# Altium footprint library 6-Connectors-4.PcbLib: 166 footprints (part 11 of 12)
Each footprint in its own frame and in the unit in brackets; x right, y up, seen from the top. Pads: shape width x height; smd on the part's side, far side on the other; paste and mask are expansions set on the pad; w line width, h text height; cw(c..) or ccw(c..) is an arc to the next point about the centre after c.
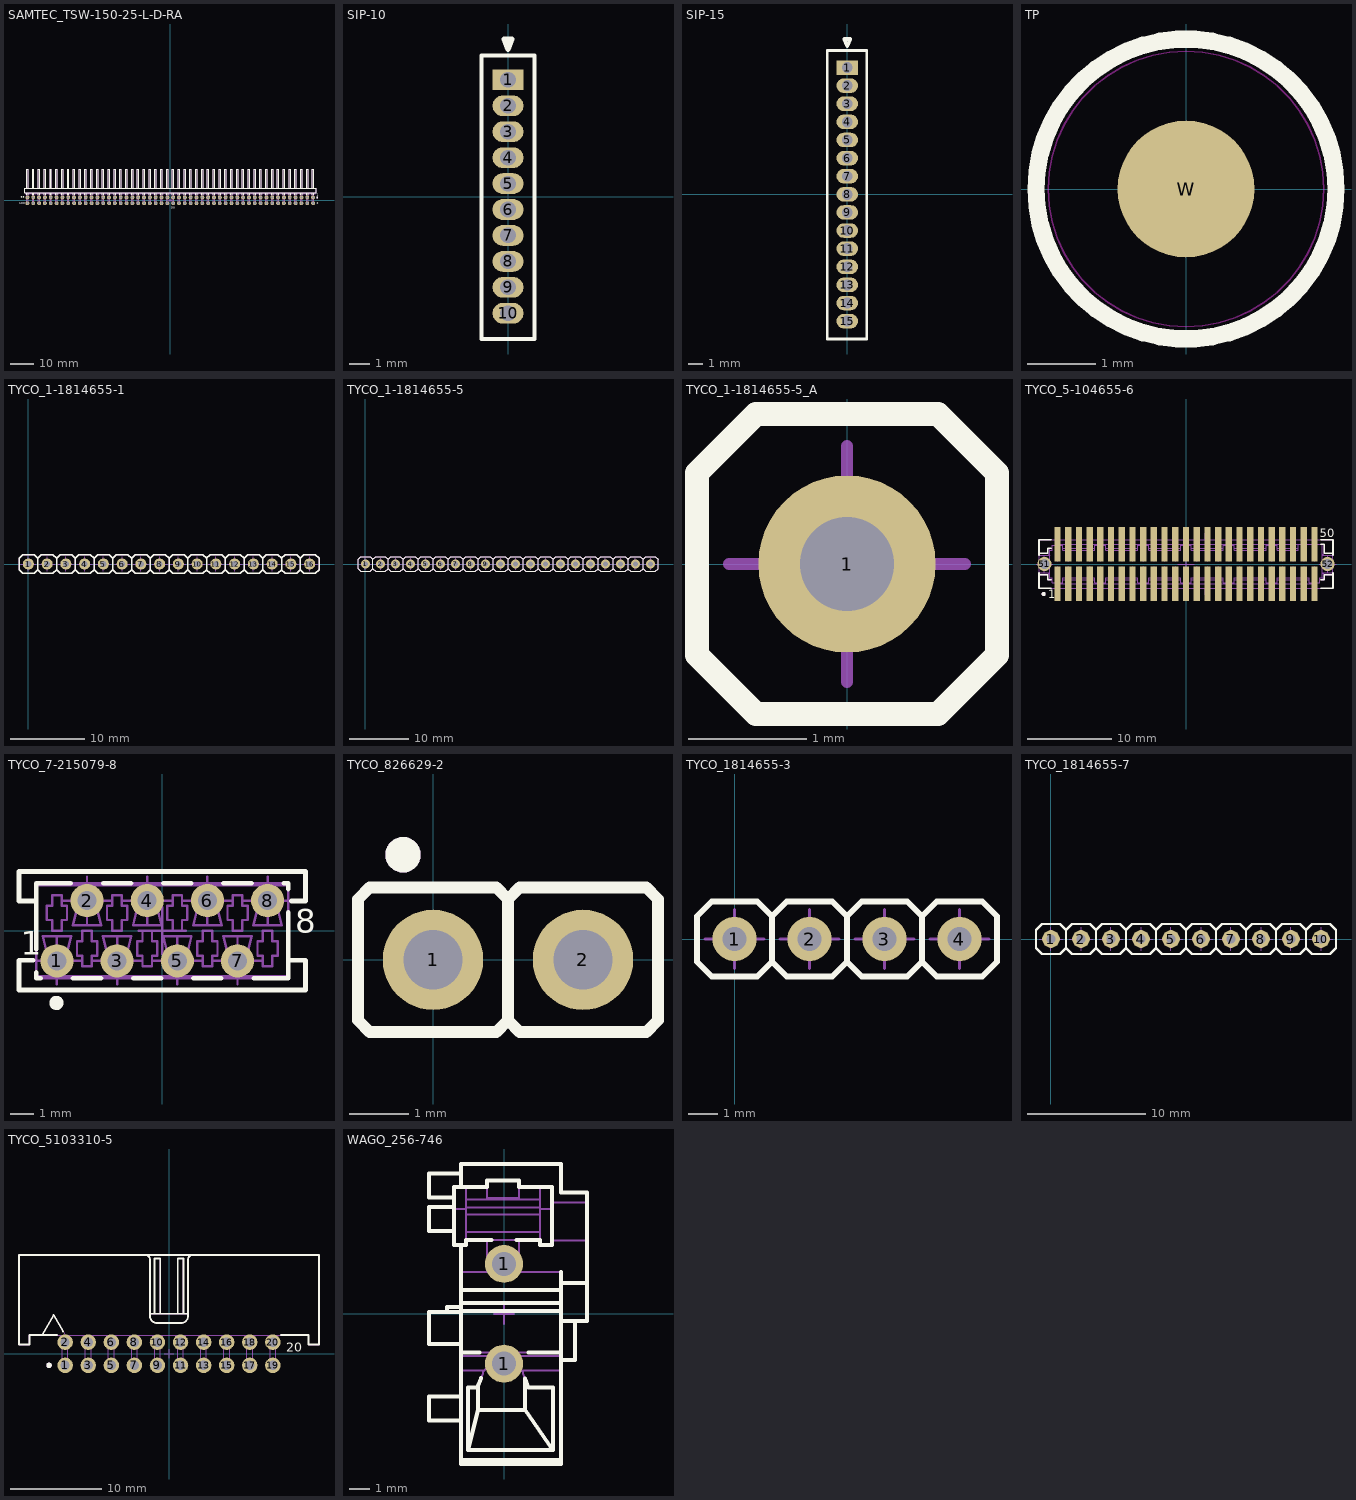
[diagram p10: the footprints below, top view; thin cyan lines are the x and y axes]

## SAMTEC_TSW-150-25-L-D-RA [mm] "100 Contacts - Pitch 2.54mm - Double Row Through Mount Right Angle Header"
height 5.56
pads (100):
  round 1.7 hole 1: 1(62.23,1.27) 2(62.23,-1.27) 3(59.69,1.27) 4(59.69,-1.27) 5(57.15,1.27) 6(57.15,-1.27) 7(54.61,1.27) 8(54.61,-1.27) 9(52.07,1.27) 10(52.07,-1.27) 11(49.53,1.27) 12(49.53,-1.27) 13(46.99,1.27) 14(46.99,-1.27) 15(44.45,1.27) 16(44.45,-1.27) 17(41.91,1.27) 18(41.91,-1.27) 19(39.37,1.27) 20(39.37,-1.27) 21(36.83,1.27) 22(36.83,-1.27) 23(34.29,1.27) 24(34.29,-1.27) 25(31.75,1.27) 26(31.75,-1.27) 27(29.21,1.27) 28(29.21,-1.27) 29(26.67,1.27) 30(26.67,-1.27) 31(24.13,1.27) 32(24.13,-1.27) 33(21.59,1.27) 34(21.59,-1.27) 35(19.05,1.27) 36(19.05,-1.27) 37(16.51,1.27) 38(16.51,-1.27) 39(13.97,1.27) 40(13.97,-1.27) 41(11.43,1.27) 42(11.43,-1.27) 43(8.89,1.27) 44(8.89,-1.27) 45(6.35,1.27) 46(6.35,-1.27) 47(3.81,1.27) 48(3.81,-1.27) 49(1.27,1.27) 50(1.27,-1.27) 51(-1.27,1.27) 52(-1.27,-1.27) 53(-3.81,1.27) 54(-3.81,-1.27) 55(-6.35,1.27) 56(-6.35,-1.27) 57(-8.89,1.27) 58(-8.89,-1.27) 59(-11.43,1.27) 60(-11.43,-1.27) 61(-13.97,1.27) 62(-13.97,-1.27) 63(-16.51,1.27) 64(-16.51,-1.27) 65(-19.05,1.27) 66(-19.05,-1.27) 67(-21.59,1.27) 68(-21.59,-1.27) 69(-24.13,1.27) 70(-24.13,-1.27) 71(-26.67,1.27) 72(-26.67,-1.27) 73(-29.21,1.27) 74(-29.21,-1.27) 75(-31.75,1.27) 76(-31.75,-1.27) 77(-34.29,1.27) 78(-34.29,-1.27) 79(-36.83,1.27) 80(-36.83,-1.27) 81(-39.37,1.27) 82(-39.37,-1.27) 83(-41.91,1.27) 84(-41.91,-1.27) 85(-44.45,1.27) 86(-44.45,-1.27) 87(-46.99,1.27) 88(-46.99,-1.27) 89(-49.53,1.27) 90(-49.53,-1.27) 91(-52.07,1.27) 92(-52.07,-1.27) 93(-54.61,1.27) 94(-54.61,-1.27) 95(-57.15,1.27) 96(-57.15,-1.27) 97(-59.69,1.27) 98(-59.69,-1.27) 99(-62.23,1.27) 100(-62.23,-1.27)
Top Overlay:
  drawing of 255 lines, arcs and shapes, not listed
  text "99" at -65.125,0.89 h1
  text "100" at -65.9,-1.735 h1
  text "50" at 0.5,-3.59 h1
  text "1" at 63.78,1.89 h1.02
  text "2" at 63.748,-1.668 h1
Mechanical 8:
  drawing of 404 lines, arcs and shapes, not listed
Mechanical 14:
  drawing of 605 lines, arcs and shapes, not listed
  text "99" at -65.125,0.89 h1
  text "100" at -65.9,-1.735 h1
  text "50" at 0.5,-3.59 h1
  text "1" at 63.78,1.89 h1.02
  text "2" at 63.748,-1.668 h1
3D body "SAMTEC_TSW-150-25-L-D-RA.stp": height 5.56, standoff -2.54, extent -63.5,-1.587 63.5,13.462
3D body "v160-080.stp": height 0.02, standoff -1.65, extent -52.87,0.47 -51.27,2.07
3D body "v160-080.stp": height 0.02, standoff -1.65, extent -55.41,0.47 -53.81,2.07
3D body "v160-080.stp": height 0.02, standoff -1.65, extent -57.95,0.47 -56.35,2.07
3D body "v160-080.stp": height 0.02, standoff -1.65, extent -60.49,0.47 -58.89,2.07
3D body "v160-080.stp": height 0.02, standoff -1.65, extent -63.03,0.47 -61.43,2.07
3D body "v160-080.stp": height 0.02, standoff -1.65, extent -52.87,-2.07 -51.27,-0.47
3D body "v160-080.stp": height 0.02, standoff -1.65, extent -55.41,-2.07 -53.81,-0.47
3D body "v160-080.stp": height 0.02, standoff -1.65, extent -57.95,-2.07 -56.35,-0.47
3D body "v160-080.stp": height 0.02, standoff -1.65, extent -60.49,-2.07 -58.89,-0.47
3D body "v160-080.stp": height 0.02, standoff -1.65, extent -63.03,-2.07 -61.43,-0.47
3D body "v160-080.stp": height 0.02, standoff -1.65, extent -40.17,0.47 -38.57,2.07
3D body "v160-080.stp": height 0.02, standoff -1.65, extent -42.71,0.47 -41.11,2.07
3D body "v160-080.stp": height 0.02, standoff -1.65, extent -45.25,0.47 -43.65,2.07
3D body "v160-080.stp": height 0.02, standoff -1.65, extent -47.79,0.47 -46.19,2.07
3D body "v160-080.stp": height 0.02, standoff -1.65, extent -50.33,0.47 -48.73,2.07
3D body "v160-080.stp": height 0.02, standoff -1.65, extent -40.17,-2.07 -38.57,-0.47
3D body "v160-080.stp": height 0.02, standoff -1.65, extent -42.71,-2.07 -41.11,-0.47
3D body "v160-080.stp": height 0.02, standoff -1.65, extent -45.25,-2.07 -43.65,-0.47
3D body "v160-080.stp": height 0.02, standoff -1.65, extent -47.79,-2.07 -46.19,-0.47
3D body "v160-080.stp": height 0.02, standoff -1.65, extent -50.33,-2.07 -48.73,-0.47
3D body "v160-080.stp": height 0.02, standoff -1.65, extent -27.47,0.47 -25.87,2.07
3D body "v160-080.stp": height 0.02, standoff -1.65, extent -30.01,0.47 -28.41,2.07
3D body "v160-080.stp": height 0.02, standoff -1.65, extent -32.55,0.47 -30.95,2.07
3D body "v160-080.stp": height 0.02, standoff -1.65, extent -35.09,0.47 -33.49,2.07
3D body "v160-080.stp": height 0.02, standoff -1.65, extent -37.63,0.47 -36.03,2.07
3D body "v160-080.stp": height 0.02, standoff -1.65, extent -27.47,-2.07 -25.87,-0.47
3D body "v160-080.stp": height 0.02, standoff -1.65, extent -30.01,-2.07 -28.41,-0.47
3D body "v160-080.stp": height 0.02, standoff -1.65, extent -32.55,-2.07 -30.95,-0.47
3D body "v160-080.stp": height 0.02, standoff -1.65, extent -35.09,-2.07 -33.49,-0.47
3D body "v160-080.stp": height 0.02, standoff -1.65, extent -37.63,-2.07 -36.03,-0.47
3D body "v160-080.stp": height 0.02, standoff -1.65, extent -14.77,0.47 -13.17,2.07
3D body "v160-080.stp": height 0.02, standoff -1.65, extent -17.31,0.47 -15.71,2.07
3D body "v160-080.stp": height 0.02, standoff -1.65, extent -19.85,0.47 -18.25,2.07
3D body "v160-080.stp": height 0.02, standoff -1.65, extent -22.39,0.47 -20.79,2.07
3D body "v160-080.stp": height 0.02, standoff -1.65, extent -24.93,0.47 -23.33,2.07
3D body "v160-080.stp": height 0.02, standoff -1.65, extent -14.77,-2.07 -13.17,-0.47
3D body "v160-080.stp": height 0.02, standoff -1.65, extent -17.31,-2.07 -15.71,-0.47
3D body "v160-080.stp": height 0.02, standoff -1.65, extent -19.85,-2.07 -18.25,-0.47
3D body "v160-080.stp": height 0.02, standoff -1.65, extent -22.39,-2.07 -20.79,-0.47
3D body "v160-080.stp": height 0.02, standoff -1.65, extent -24.93,-2.07 -23.33,-0.47
3D body "v160-080.stp": height 0.02, standoff -1.65, extent -2.07,0.47 -0.47,2.07
3D body "v160-080.stp": height 0.02, standoff -1.65, extent -4.61,0.47 -3.01,2.07
3D body "v160-080.stp": height 0.02, standoff -1.65, extent -7.15,0.47 -5.55,2.07
3D body "v160-080.stp": height 0.02, standoff -1.65, extent -9.69,0.47 -8.09,2.07
3D body "v160-080.stp": height 0.02, standoff -1.65, extent -12.23,0.47 -10.63,2.07
3D body "v160-080.stp": height 0.02, standoff -1.65, extent -2.07,-2.07 -0.47,-0.47
3D body "v160-080.stp": height 0.02, standoff -1.65, extent -4.61,-2.07 -3.01,-0.47
3D body "v160-080.stp": height 0.02, standoff -1.65, extent -7.15,-2.07 -5.55,-0.47
3D body "v160-080.stp": height 0.02, standoff -1.65, extent -9.69,-2.07 -8.09,-0.47
3D body "v160-080.stp": height 0.02, standoff -1.65, extent -12.23,-2.07 -10.63,-0.47
3D body "v160-080.stp": height 0.02, standoff -1.65, extent 10.63,0.47 12.23,2.07
3D body "v160-080.stp": height 0.02, standoff -1.65, extent 8.09,0.47 9.69,2.07
3D body "v160-080.stp": height 0.02, standoff -1.65, extent 5.55,0.47 7.15,2.07
3D body "v160-080.stp": height 0.02, standoff -1.65, extent 3.01,0.47 4.61,2.07
3D body "v160-080.stp": height 0.02, standoff -1.65, extent 0.47,0.47 2.07,2.07
3D body "v160-080.stp": height 0.02, standoff -1.65, extent 10.63,-2.07 12.23,-0.47
3D body "v160-080.stp": height 0.02, standoff -1.65, extent 8.09,-2.07 9.69,-0.47
3D body "v160-080.stp": height 0.02, standoff -1.65, extent 5.55,-2.07 7.15,-0.47
3D body "v160-080.stp": height 0.02, standoff -1.65, extent 3.01,-2.07 4.61,-0.47
3D body "v160-080.stp": height 0.02, standoff -1.65, extent 0.47,-2.07 2.07,-0.47
3D body "v160-080.stp": height 0.02, standoff -1.65, extent 23.33,0.47 24.93,2.07
3D body "v160-080.stp": height 0.02, standoff -1.65, extent 20.79,0.47 22.39,2.07
3D body "v160-080.stp": height 0.02, standoff -1.65, extent 18.25,0.47 19.85,2.07
3D body "v160-080.stp": height 0.02, standoff -1.65, extent 15.71,0.47 17.31,2.07
3D body "v160-080.stp": height 0.02, standoff -1.65, extent 13.17,0.47 14.77,2.07
3D body "v160-080.stp": height 0.02, standoff -1.65, extent 23.33,-2.07 24.93,-0.47
3D body "v160-080.stp": height 0.02, standoff -1.65, extent 20.79,-2.07 22.39,-0.47
3D body "v160-080.stp": height 0.02, standoff -1.65, extent 18.25,-2.07 19.85,-0.47
3D body "v160-080.stp": height 0.02, standoff -1.65, extent 15.71,-2.07 17.31,-0.47
3D body "v160-080.stp": height 0.02, standoff -1.65, extent 13.17,-2.07 14.77,-0.47
3D body "v160-080.stp": height 0.02, standoff -1.65, extent 36.03,0.47 37.63,2.07
3D body "v160-080.stp": height 0.02, standoff -1.65, extent 33.49,0.47 35.09,2.07
3D body "v160-080.stp": height 0.02, standoff -1.65, extent 30.95,0.47 32.55,2.07
3D body "v160-080.stp": height 0.02, standoff -1.65, extent 28.41,0.47 30.01,2.07
3D body "v160-080.stp": height 0.02, standoff -1.65, extent 25.87,0.47 27.47,2.07
3D body "v160-080.stp": height 0.02, standoff -1.65, extent 36.03,-2.07 37.63,-0.47
3D body "v160-080.stp": height 0.02, standoff -1.65, extent 33.49,-2.07 35.09,-0.47
3D body "v160-080.stp": height 0.02, standoff -1.65, extent 30.95,-2.07 32.55,-0.47
3D body "v160-080.stp": height 0.02, standoff -1.65, extent 28.41,-2.07 30.01,-0.47
3D body "v160-080.stp": height 0.02, standoff -1.65, extent 25.87,-2.07 27.47,-0.47
3D body "v160-080.stp": height 0.02, standoff -1.65, extent 48.73,0.47 50.33,2.07
3D body "v160-080.stp": height 0.02, standoff -1.65, extent 46.19,0.47 47.79,2.07
3D body "v160-080.stp": height 0.02, standoff -1.65, extent 43.65,0.47 45.25,2.07
3D body "v160-080.stp": height 0.02, standoff -1.65, extent 41.11,0.47 42.71,2.07
3D body "v160-080.stp": height 0.02, standoff -1.65, extent 38.57,0.47 40.17,2.07
3D body "v160-080.stp": height 0.02, standoff -1.65, extent 48.73,-2.07 50.33,-0.47
3D body "v160-080.stp": height 0.02, standoff -1.65, extent 46.19,-2.07 47.79,-0.47
3D body "v160-080.stp": height 0.02, standoff -1.65, extent 43.65,-2.07 45.25,-0.47
3D body "v160-080.stp": height 0.02, standoff -1.65, extent 41.11,-2.07 42.71,-0.47
3D body "v160-080.stp": height 0.02, standoff -1.65, extent 38.57,-2.07 40.17,-0.47
3D body "v160-080.stp": height 0.02, standoff -1.65, extent 61.43,0.47 63.03,2.07
3D body "v160-080.stp": height 0.02, standoff -1.65, extent 58.89,0.47 60.49,2.07
3D body "v160-080.stp": height 0.02, standoff -1.65, extent 56.35,0.47 57.95,2.07
3D body "v160-080.stp": height 0.02, standoff -1.65, extent 53.81,0.47 55.41,2.07
3D body "v160-080.stp": height 0.02, standoff -1.65, extent 51.27,0.47 52.87,2.07
3D body "v160-080.stp": height 0.02, standoff -1.65, extent 61.43,-2.07 63.03,-0.47
3D body "v160-080.stp": height 0.02, standoff -1.65, extent 58.89,-2.07 60.49,-0.47
3D body "v160-080.stp": height 0.02, standoff -1.65, extent 56.35,-2.07 57.95,-0.47
3D body "v160-080.stp": height 0.02, standoff -1.65, extent 53.81,-2.07 55.41,-0.47
3D body "v160-080.stp": height 0.02, standoff -1.65, extent 51.27,-2.07 52.87,-0.47

## SIP-10 [mil]
height 962.6
pads (10):
  rect 60x40 / inner round 40 / far side rect 60x40 hole 30: 1(0,225)
  oval 60x40 / inner round 40 / far side oval 60x40 hole 30: 2(0,175) 3(0,125) 4(0,75) 5(0,25) 6(0,-25) 7(0,-75) 8(0,-125) 9(0,-175) 10(0,-225)
Top Overlay:
  lines w8: -51.18,-274.61 51.18,-274.61 51.18,272.24 -51.18,272.24 -51.18,-274.61
  lines w10: -7.87,303.74 7.87,303.74 0,284.06 -7.87,303.74
3D body "sip-10.stp": height 165.35, standoff -98.43, extent -43.31,-265.74 43.3,265.75

## SIP-15 [mil]
height 962.6
pads (15):
  rect 60x40 / inner round 40 / far side rect 60x40 hole 30: 1(0,350)
  oval 60x40 / inner round 40 / far side oval 60x40 hole 30: 2(0,300) 3(0,250) 4(0,200) 5(0,150) 6(0,100) 7(0,50) 8(0,0) 9(0,-50) 10(0,-100) 11(0,-150) 12(0,-200) 13(0,-250) 14(0,-300) 15(0,-350)
Top Overlay:
  lines w8: -55.12,-399.35 -21.46,-399.35 53.64,-399.35 53.64,397.24 -55.12,397.24 -55.12,-399.35
  lines w10: -7.87,428.74 0,409.06 7.87,428.74 -7.87,428.74
3D body "sip-15.stp": height 161.42, standoff -118.11, extent -47.24,-389.76 47.25,389.76

## TP [mm]
height 11.7
pads (1):
  round 2 smd mask+1: W(0,0)
Top Overlay:
  circle w0.254: c0,0 r2.195
Keep-Out Layer:
  circle w0.025: c0,0 r2.017
3D body "1_016-1_016-3_tp.stp": height 0.02, standoff 0, extent -1.5,-1.5 1.5,1.5

## TYCO_1-1814655-1 [mm] "16 Positions, Pitch 2.54mm, Width 2.54mm, Heigh 4.4mm, SIP Straight Socket"
height 4.4
pads (16):
  round 1.5 hole 0.8: 1(0,0) 2(2.54,0) 3(5.08,0) 4(7.62,0) 5(10.16,0) 6(12.7,0) 7(15.24,0) 8(17.78,0) 9(20.32,0) 10(22.86,0) 11(25.4,0) 12(27.94,0) 13(30.48,0) 14(33.02,0) 15(35.56,0) 16(38.1,0)
Top Overlay:
  lines w0.2: 1.27,-0.77 1.27,0.77 ; 1.27,-0.77 1.77,-1.27 3.31,-1.27 3.81,-0.77 ; 1.27,-0.77 0.77,-1.27 -0.77,-1.27 -1.27,-0.77 -1.27,0.77 -0.77,1.27 0.77,1.27 1.27,0.77 ; 1.27,0.77 1.77,1.27 3.31,1.27 3.81,0.77 ; 3.81,-0.77 3.81,0.77 ; 3.81,-0.77 4.31,-1.27 5.85,-1.27 6.35,-0.77 ; 3.81,0.77 4.31,1.27 5.85,1.27 6.35,0.77 ; 6.35,-0.77 6.35,0.77 ; 6.35,-0.77 6.85,-1.27 8.39,-1.27 8.89,-0.77 ; 6.35,0.77 6.85,1.27 8.39,1.27 8.89,0.77 ; 8.89,-0.77 8.89,0.77 ; 8.89,-0.77 9.39,-1.27 10.93,-1.27 11.43,-0.77 ; 8.89,0.77 9.39,1.27 10.93,1.27 11.43,0.77 ; 11.43,-0.77 11.43,0.77 ; 11.43,-0.77 11.93,-1.27 13.47,-1.27 13.97,-0.77 ; 11.43,0.77 11.93,1.27 13.47,1.27 13.97,0.77 ; 13.97,-0.77 13.97,0.77 ; 13.97,-0.77 14.47,-1.27 16.01,-1.27 16.51,-0.77 ; 13.97,0.77 14.47,1.27 16.01,1.27 16.51,0.77 ; 16.51,-0.77 16.51,0.77 ; 16.51,-0.77 17.01,-1.27 18.55,-1.27 19.05,-0.77 ; 16.51,0.77 17.01,1.27 18.55,1.27 19.05,0.77 ; 19.05,-0.77 19.05,0.77 ; 19.05,-0.77 19.55,-1.27 21.09,-1.27 21.59,-0.77 ; 19.05,0.77 19.55,1.27 21.09,1.27 21.59,0.77 ; 21.59,-0.77 21.59,0.77 ; 21.59,-0.77 22.09,-1.27 23.63,-1.27 24.13,-0.77 ; 21.59,0.77 22.09,1.27 23.63,1.27 24.13,0.77 ; 24.13,-0.77 24.13,0.77 ; 24.13,-0.77 24.63,-1.27 26.17,-1.27 26.67,-0.77 ; 24.13,0.77 24.63,1.27 26.17,1.27 26.67,0.77 ; 26.67,-0.77 27.17,-1.27 28.71,-1.27 29.21,-0.77 ; 26.67,-0.77 26.67,0.77 ; 26.67,0.77 27.17,1.27 28.71,1.27 29.21,0.77 ; 29.21,-0.77 29.71,-1.27 31.25,-1.27 31.75,-0.77 ; 29.21,-0.77 29.21,0.77 ; 29.21,0.77 29.71,1.27 31.25,1.27 31.75,0.77 ; 31.75,-0.77 32.25,-1.27 33.79,-1.27 34.29,-0.77 ; 31.75,-0.77 31.75,0.77 ; 31.75,0.77 32.25,1.27 33.79,1.27 34.29,0.77 ; 34.29,-0.77 34.29,0.77 ; 34.29,-0.77 34.79,-1.27 36.33,-1.27 36.83,-0.77 ; 34.29,0.77 34.79,1.27 36.33,1.27 36.83,0.77 ; 36.83,-0.77 36.83,0.77 ; 36.83,-0.77 37.33,-1.27 38.87,-1.27 39.37,-0.77 39.37,0.77 38.87,1.27 37.33,1.27 36.83,0.77
Mechanical 8:
  lines w0.1: -1,0 0,0 ; 0,-1 0,0 ; 0,1 0,0 ; 1,0 0,0 ; 1.54,0 2.54,0 ; 2.54,-1 2.54,0 ; 2.54,1 2.54,0 ; 3.54,0 2.54,0 ; 4.08,0 5.08,0 ; 5.08,-1 5.08,0 ; 5.08,1 5.08,0 ; 6.08,0 5.08,0 ; 6.62,0 7.62,0 ; 7.62,-1 7.62,0 ; 7.62,1 7.62,0 ; 8.62,0 7.62,0 ; 9.16,0 10.16,0 ; 10.16,-1 10.16,0 ; 10.16,1 10.16,0 ; 11.16,0 10.16,0 ; 11.7,0 12.7,0 ; 12.7,-1 12.7,0 ; 12.7,1 12.7,0 ; 13.7,0 12.7,0 ; 14.24,0 15.24,0 ; 15.24,-1 15.24,0 ; 15.24,1 15.24,0 ; 16.24,0 15.24,0 ; 16.78,0 17.78,0 ; 17.78,-1 17.78,0 ; 17.78,1 17.78,0 ; 18.78,0 17.78,0 ; 19.32,0 20.32,0 ; 20.32,-1 20.32,0 ; 20.32,1 20.32,0 ; 21.32,0 20.32,0 ; 21.86,0 22.86,0 ; 22.86,-1 22.86,0 ; 22.86,1 22.86,0 ; 23.86,0 22.86,0 ; 24.4,0 25.4,0 ; 25.4,-1 25.4,0 ; 25.4,1 25.4,0 ; 26.4,0 25.4,0 ; 26.94,0 27.94,0 ; 27.94,-1 27.94,0 ; 27.94,1 27.94,0 ; 28.94,0 27.94,0 ; 29.48,0 30.48,0 ; 30.48,-1 30.48,0 ; 30.48,1 30.48,0 ; 31.48,0 30.48,0 ; 32.02,0 33.02,0 ; 33.02,-1 33.02,0 ; 33.02,1 33.02,0 ; 34.02,0 33.02,0 ; 34.56,0 35.56,0 ; 35.56,-1 35.56,0 ; 35.56,1 35.56,0 ; 36.56,0 35.56,0 ; 37.1,0 38.1,0 ; 38.1,-1 38.1,0 ; 38.1,1 38.1,0 ; 39.1,0 38.1,0
Mechanical 14:
  lines w0.1: 1.27,-0.77 1.27,0.77 ; 1.27,-0.77 1.77,-1.27 3.31,-1.27 3.81,-0.77 ; 1.27,-0.77 0.77,-1.27 -0.77,-1.27 -1.27,-0.77 -1.27,0.77 -0.77,1.27 0.77,1.27 1.27,0.77 ; 1.27,0.77 1.77,1.27 3.31,1.27 3.81,0.77 ; 3.81,-0.77 3.81,0.77 ; 3.81,-0.77 4.31,-1.27 5.85,-1.27 6.35,-0.77 ; 3.81,0.77 4.31,1.27 5.85,1.27 6.35,0.77 ; 6.35,-0.77 6.35,0.77 ; 6.35,-0.77 6.85,-1.27 8.39,-1.27 8.89,-0.77 ; 6.35,0.77 6.85,1.27 8.39,1.27 8.89,0.77 ; 8.89,-0.77 8.89,0.77 ; 8.89,-0.77 9.39,-1.27 10.93,-1.27 11.43,-0.77 ; 8.89,0.77 9.39,1.27 10.93,1.27 11.43,0.77 ; 11.43,-0.77 11.43,0.77 ; 11.43,-0.77 11.93,-1.27 13.47,-1.27 13.97,-0.77 ; 11.43,0.77 11.93,1.27 13.47,1.27 13.97,0.77 ; 13.97,-0.77 13.97,0.77 ; 13.97,-0.77 14.47,-1.27 16.01,-1.27 16.51,-0.77 ; 13.97,0.77 14.47,1.27 16.01,1.27 16.51,0.77 ; 16.51,-0.77 16.51,0.77 ; 16.51,-0.77 17.01,-1.27 18.55,-1.27 19.05,-0.77 ; 16.51,0.77 17.01,1.27 18.55,1.27 19.05,0.77 ; 19.05,-0.77 19.05,0.77 ; 19.05,-0.77 19.55,-1.27 21.09,-1.27 21.59,-0.77 ; 19.05,0.77 19.55,1.27 21.09,1.27 21.59,0.77 ; 21.59,-0.77 21.59,0.77 ; 21.59,-0.77 22.09,-1.27 23.63,-1.27 24.13,-0.77 ; 21.59,0.77 22.09,1.27 23.63,1.27 24.13,0.77 ; 24.13,-0.77 24.13,0.77 ; 24.13,-0.77 24.63,-1.27 26.17,-1.27 26.67,-0.77 ; 24.13,0.77 24.63,1.27 26.17,1.27 26.67,0.77 ; 26.67,-0.77 27.17,-1.27 28.71,-1.27 29.21,-0.77 ; 26.67,-0.77 26.67,0.77 ; 26.67,0.77 27.17,1.27 28.71,1.27 29.21,0.77 ; 29.21,-0.77 29.71,-1.27 31.25,-1.27 31.75,-0.77 ; 29.21,-0.77 29.21,0.77 ; 29.21,0.77 29.71,1.27 31.25,1.27 31.75,0.77 ; 31.75,-0.77 32.25,-1.27 33.79,-1.27 34.29,-0.77 ; 31.75,-0.77 31.75,0.77 ; 31.75,0.77 32.25,1.27 33.79,1.27 34.29,0.77 ; 34.29,-0.77 34.29,0.77 ; 34.29,-0.77 34.79,-1.27 36.33,-1.27 36.83,-0.77 ; 34.29,0.77 34.79,1.27 36.33,1.27 36.83,0.77 ; 36.83,-0.77 36.83,0.77 ; 36.83,-0.77 37.33,-1.27 38.87,-1.27 39.37,-0.77 39.37,0.77 38.87,1.27 37.33,1.27 36.83,0.77
3D body "TYCO_1-1814655-1.stp": height 4.4, standoff -2.9, extent -1.27,-1.27 39.37,1.27

## TYCO_1-1814655-5 [mm] "20 Positions, Pitch 2.54mm, Width 2.54mm, Heigh 4.4mm, SIP Straight Socket"
height 4.4
pads (20):
  round 1.5 hole 0.8: 1(0,0) 2(2.54,0) 3(5.08,0) 4(7.62,0) 5(10.16,0) 6(12.7,0) 7(15.24,0) 8(17.78,0) 9(20.32,0) 10(22.86,0) 11(25.4,0) 12(27.94,0) 13(30.48,0) 14(33.02,0) 15(35.56,0) 16(38.1,0) 17(40.64,0) 18(43.18,0) 19(45.72,0) 20(48.26,0)
Top Overlay:
  lines w0.2: 1.27,-0.77 0.77,-1.27 -0.77,-1.27 -1.27,-0.77 -1.27,0.77 -0.77,1.27 0.77,1.27 1.27,0.77 ; 1.27,-0.77 1.77,-1.27 3.31,-1.27 3.81,-0.77 ; 1.27,-0.77 1.27,0.77 ; 1.27,0.77 1.77,1.27 3.31,1.27 3.81,0.77 ; 3.81,-0.77 4.31,-1.27 5.85,-1.27 6.35,-0.77 ; 3.81,-0.77 3.81,0.77 ; 3.81,0.77 4.31,1.27 5.85,1.27 6.35,0.77 ; 6.35,-0.77 6.85,-1.27 8.39,-1.27 8.89,-0.77 ; 6.35,-0.77 6.35,0.77 ; 6.35,0.77 6.85,1.27 8.39,1.27 8.89,0.77 ; 8.89,-0.77 9.39,-1.27 10.93,-1.27 11.43,-0.77 ; 8.89,-0.77 8.89,0.77 ; 8.89,0.77 9.39,1.27 10.93,1.27 11.43,0.77 ; 11.43,-0.77 11.93,-1.27 13.47,-1.27 13.97,-0.77 ; 11.43,-0.77 11.43,0.77 ; 11.43,0.77 11.93,1.27 13.47,1.27 13.97,0.77 ; 13.97,-0.77 14.47,-1.27 16.01,-1.27 16.51,-0.77 ; 13.97,-0.77 13.97,0.77 ; 13.97,0.77 14.47,1.27 16.01,1.27 16.51,0.77 ; 16.51,-0.77 17.01,-1.27 18.55,-1.27 19.05,-0.77 ; 16.51,-0.77 16.51,0.77 ; 16.51,0.77 17.01,1.27 18.55,1.27 19.05,0.77 ; 19.05,-0.77 19.55,-1.27 21.09,-1.27 21.59,-0.77 ; 19.05,-0.77 19.05,0.77 ; 19.05,0.77 19.55,1.27 21.09,1.27 21.59,0.77 ; 21.59,-0.77 22.09,-1.27 23.63,-1.27 24.13,-0.77 ; 21.59,-0.77 21.59,0.77 ; 21.59,0.77 22.09,1.27 23.63,1.27 24.13,0.77 ; 24.13,-0.77 24.63,-1.27 26.17,-1.27 26.67,-0.77 ; 24.13,-0.77 24.13,0.77 ; 24.13,0.77 24.63,1.27 26.17,1.27 26.67,0.77 ; 26.67,-0.77 26.67,0.77 ; 26.67,-0.77 27.17,-1.27 28.71,-1.27 29.21,-0.77 ; 26.67,0.77 27.17,1.27 28.71,1.27 29.21,0.77 ; 29.21,-0.77 29.21,0.77 ; 29.21,-0.77 29.71,-1.27 31.25,-1.27 31.75,-0.77 ; 29.21,0.77 29.71,1.27 31.25,1.27 31.75,0.77 ; 31.75,-0.77 31.75,0.77 ; 31.75,-0.77 32.25,-1.27 33.79,-1.27 34.29,-0.77 ; 31.75,0.77 32.25,1.27 33.79,1.27 34.29,0.77 ; 34.29,-0.77 34.79,-1.27 36.33,-1.27 36.83,-0.77 ; 34.29,-0.77 34.29,0.77 ; 34.29,0.77 34.79,1.27 36.33,1.27 36.83,0.77 ; 36.83,-0.77 37.33,-1.27 38.87,-1.27 39.37,-0.77 ; 36.83,-0.77 36.83,0.77 ; 36.83,0.77 37.33,1.27 38.87,1.27 39.37,0.77 ; 39.37,-0.77 39.37,0.77 ; 39.37,-0.77 39.87,-1.27 41.41,-1.27 41.91,-0.77 ; 39.37,0.77 39.87,1.27 41.41,1.27 41.91,0.77 ; 41.91,-0.77 42.41,-1.27 43.95,-1.27 44.45,-0.77 ; 41.91,-0.77 41.91,0.77 ; 41.91,0.77 42.41,1.27 43.95,1.27 44.45,0.77 ; 44.45,-0.77 44.45,0.77 ; 44.45,-0.77 44.95,-1.27 46.49,-1.27 46.99,-0.77 ; 44.45,0.77 44.95,1.27 46.49,1.27 46.99,0.77 ; 46.99,-0.77 46.99,0.77 ; 46.99,-0.77 47.49,-1.27 49.03,-1.27 49.53,-0.77 49.53,0.77 49.03,1.27 47.49,1.27 46.99,0.77
Mechanical 8:
  lines w0.1: -1,0 0,0 ; 0,-1 0,0 ; 0,1 0,0 ; 1,0 0,0 ; 1.54,0 2.54,0 ; 2.54,-1 2.54,0 ; 2.54,1 2.54,0 ; 3.54,0 2.54,0 ; 4.08,0 5.08,0 ; 5.08,-1 5.08,0 ; 5.08,1 5.08,0 ; 6.08,0 5.08,0 ; 6.62,0 7.62,0 ; 7.62,-1 7.62,0 ; 7.62,1 7.62,0 ; 8.62,0 7.62,0 ; 9.16,0 10.16,0 ; 10.16,-1 10.16,0 ; 10.16,1 10.16,0 ; 11.16,0 10.16,0 ; 11.7,0 12.7,0 ; 12.7,-1 12.7,0 ; 12.7,1 12.7,0 ; 13.7,0 12.7,0 ; 14.24,0 15.24,0 ; 15.24,-1 15.24,0 ; 15.24,1 15.24,0 ; 16.24,0 15.24,0 ; 16.78,0 17.78,0 ; 17.78,-1 17.78,0 ; 17.78,1 17.78,0 ; 18.78,0 17.78,0 ; 19.32,0 20.32,0 ; 20.32,-1 20.32,0 ; 20.32,1 20.32,0 ; 21.32,0 20.32,0 ; 21.86,0 22.86,0 ; 22.86,-1 22.86,0 ; 22.86,1 22.86,0 ; 23.86,0 22.86,0 ; 24.4,0 25.4,0 ; 25.4,-1 25.4,0 ; 25.4,1 25.4,0 ; 26.4,0 25.4,0 ; 26.94,0 27.94,0 ; 27.94,-1 27.94,0 ; 27.94,1 27.94,0 ; 28.94,0 27.94,0 ; 29.48,0 30.48,0 ; 30.48,-1 30.48,0 ; 30.48,1 30.48,0 ; 31.48,0 30.48,0 ; 32.02,0 33.02,0 ; 33.02,-1 33.02,0 ; 33.02,1 33.02,0 ; 34.02,0 33.02,0 ; 34.56,0 35.56,0 ; 35.56,-1 35.56,0 ; 35.56,1 35.56,0 ; 36.56,0 35.56,0 ; 37.1,0 38.1,0 ; 38.1,-1 38.1,0 ; 38.1,1 38.1,0 ; 39.1,0 38.1,0 ; 39.64,0 40.64,0 ; 40.64,-1 40.64,0 ; 40.64,1 40.64,0 ; 41.64,0 40.64,0 ; 42.18,0 43.18,0 ; 43.18,-1 43.18,0 ; 43.18,1 43.18,0 ; 44.18,0 43.18,0 ; 44.72,0 45.72,0 ; 45.72,-1 45.72,0 ; 45.72,1 45.72,0 ; 46.72,0 45.72,0 ; 47.26,0 48.26,0 ; 48.26,-1 48.26,0 ; 48.26,1 48.26,0 ; 49.26,0 48.26,0
Mechanical 14:
  lines w0.1: 1.27,-0.77 0.77,-1.27 -0.77,-1.27 -1.27,-0.77 -1.27,0.77 -0.77,1.27 0.77,1.27 1.27,0.77 ; 1.27,-0.77 1.77,-1.27 3.31,-1.27 3.81,-0.77 ; 1.27,-0.77 1.27,0.77 ; 1.27,0.77 1.77,1.27 3.31,1.27 3.81,0.77 ; 3.81,-0.77 4.31,-1.27 5.85,-1.27 6.35,-0.77 ; 3.81,-0.77 3.81,0.77 ; 3.81,0.77 4.31,1.27 5.85,1.27 6.35,0.77 ; 6.35,-0.77 6.85,-1.27 8.39,-1.27 8.89,-0.77 ; 6.35,-0.77 6.35,0.77 ; 6.35,0.77 6.85,1.27 8.39,1.27 8.89,0.77 ; 8.89,-0.77 9.39,-1.27 10.93,-1.27 11.43,-0.77 ; 8.89,-0.77 8.89,0.77 ; 8.89,0.77 9.39,1.27 10.93,1.27 11.43,0.77 ; 11.43,-0.77 11.93,-1.27 13.47,-1.27 13.97,-0.77 ; 11.43,-0.77 11.43,0.77 ; 11.43,0.77 11.93,1.27 13.47,1.27 13.97,0.77 ; 13.97,-0.77 14.47,-1.27 16.01,-1.27 16.51,-0.77 ; 13.97,-0.77 13.97,0.77 ; 13.97,0.77 14.47,1.27 16.01,1.27 16.51,0.77 ; 16.51,-0.77 17.01,-1.27 18.55,-1.27 19.05,-0.77 ; 16.51,-0.77 16.51,0.77 ; 16.51,0.77 17.01,1.27 18.55,1.27 19.05,0.77 ; 19.05,-0.77 19.55,-1.27 21.09,-1.27 21.59,-0.77 ; 19.05,-0.77 19.05,0.77 ; 19.05,0.77 19.55,1.27 21.09,1.27 21.59,0.77 ; 21.59,-0.77 22.09,-1.27 23.63,-1.27 24.13,-0.77 ; 21.59,-0.77 21.59,0.77 ; 21.59,0.77 22.09,1.27 23.63,1.27 24.13,0.77 ; 24.13,-0.77 24.63,-1.27 26.17,-1.27 26.67,-0.77 ; 24.13,-0.77 24.13,0.77 ; 24.13,0.77 24.63,1.27 26.17,1.27 26.67,0.77 ; 26.67,-0.77 26.67,0.77 ; 26.67,-0.77 27.17,-1.27 28.71,-1.27 29.21,-0.77 ; 26.67,0.77 27.17,1.27 28.71,1.27 29.21,0.77 ; 29.21,-0.77 29.21,0.77 ; 29.21,-0.77 29.71,-1.27 31.25,-1.27 31.75,-0.77 ; 29.21,0.77 29.71,1.27 31.25,1.27 31.75,0.77 ; 31.75,-0.77 31.75,0.77 ; 31.75,-0.77 32.25,-1.27 33.79,-1.27 34.29,-0.77 ; 31.75,0.77 32.25,1.27 33.79,1.27 34.29,0.77 ; 34.29,-0.77 34.79,-1.27 36.33,-1.27 36.83,-0.77 ; 34.29,-0.77 34.29,0.77 ; 34.29,0.77 34.79,1.27 36.33,1.27 36.83,0.77 ; 36.83,-0.77 37.33,-1.27 38.87,-1.27 39.37,-0.77 ; 36.83,-0.77 36.83,0.77 ; 36.83,0.77 37.33,1.27 38.87,1.27 39.37,0.77 ; 39.37,-0.77 39.37,0.77 ; 39.37,-0.77 39.87,-1.27 41.41,-1.27 41.91,-0.77 ; 39.37,0.77 39.87,1.27 41.41,1.27 41.91,0.77 ; 41.91,-0.77 42.41,-1.27 43.95,-1.27 44.45,-0.77 ; 41.91,-0.77 41.91,0.77 ; 41.91,0.77 42.41,1.27 43.95,1.27 44.45,0.77 ; 44.45,-0.77 44.45,0.77 ; 44.45,-0.77 44.95,-1.27 46.49,-1.27 46.99,-0.77 ; 44.45,0.77 44.95,1.27 46.49,1.27 46.99,0.77 ; 46.99,-0.77 46.99,0.77 ; 46.99,-0.77 47.49,-1.27 49.03,-1.27 49.53,-0.77 49.53,0.77 49.03,1.27 47.49,1.27 46.99,0.77